# Altium footprint library Connectors.PcbLib: 36 footprints (part 1 of 3)
Each footprint in its own frame and in the unit in brackets; x right, y up, seen from the top. Pads: shape width x height; smd on the part's side, far side on the other; paste and mask are expansions set on the pad; w line width, h text height; cw(c..) or ccw(c..) is an arc to the next point about the centre after c.
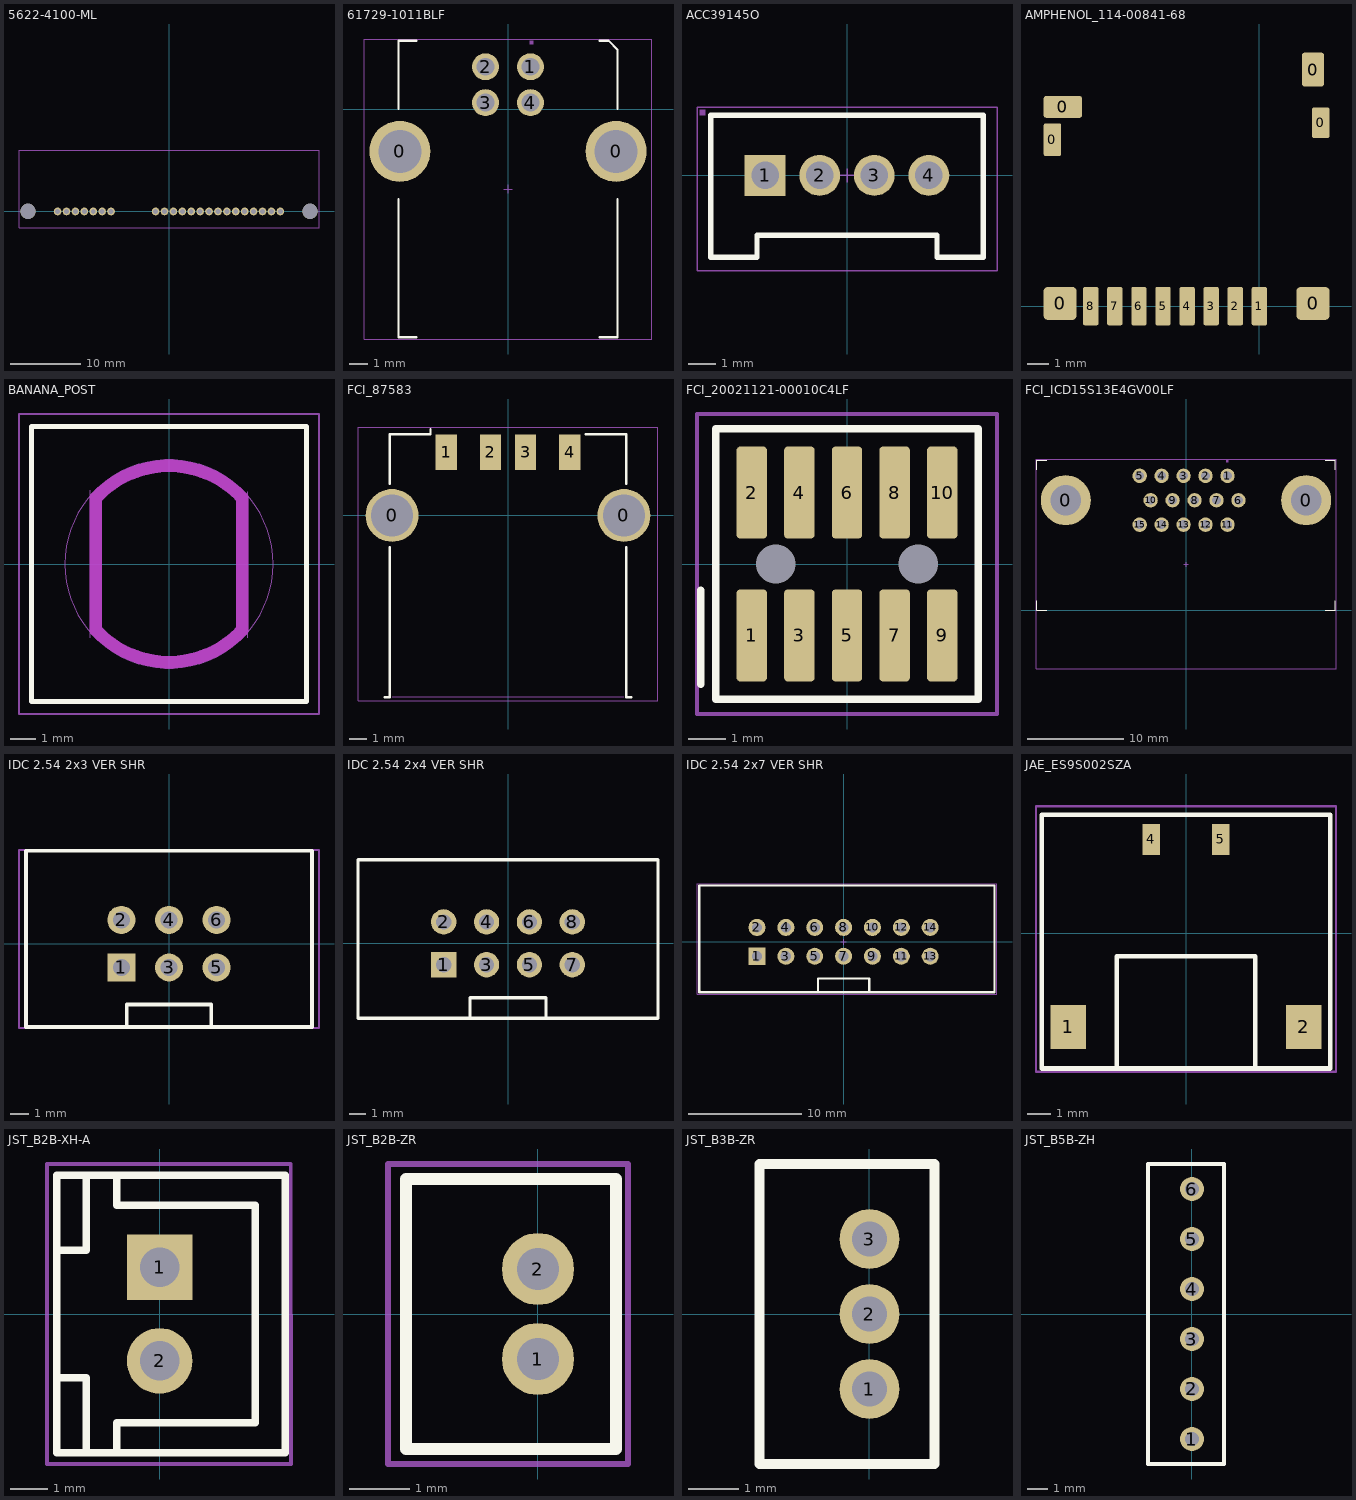
[diagram p0: the footprints below, top view; thin cyan lines are the x and y axes]

## 5622-4100-ML [mm] "SATA Combo connector"
height 5.6
pads (24):
  round 1.1 hole 0.7 unplated: P1(-1.91,0) P2(-0.64,0) P3(0.63,0) P4(1.9,0) P5(3.17,0) P6(4.44,0) P7(5.71,0) P8(6.98,0) P9(8.25,0) P10(9.52,0) P11(10.79,0) P12(12.06,0) P13(13.33,0) P14(14.6,0) P15(15.87,0) S1(-15.88,0) S2(-14.61,0) S3(-13.34,0) S4(-12.07,0) S5(-10.8,0) S6(-9.53,0) S7(-8.26,0)
  round 2.2 hole 2.2 unplated: ""(-20.1,0) ""(20.1,0)
15. Courtyard TOP:
  lines w0.1: -21.38,-2.3 21.38,-2.3 21.38,8.7 -21.38,8.7 -21.38,-2.3
  text ".designator" at -1.91,2.54 h2
3D body: height 5.6, standoff -2.5, extent -21.38,-2.3 21.38,8.7

## 61729-1011BLF [mm] "USB Connectors 4P R/A RECEPTACLE STYLE B"
height 10.3
pads (6):
  round 3.4 hole 2.4: 0(-6.02,-2.355) 0(6.02,-2.355)
  round 1.5 hole 1: 1(1.25,2.355) 2(-1.25,2.355) 3(-1.25,0.355) 4(1.25,0.355)
Top Overlay:
  lines w0.12: -6.1,-5 -6.1,-12.7 -5.1,-12.7 ; -6.1,0 -6.1,3.8 -5.1,3.8 ; 5.1,-12.7 6.1,-12.7 6.1,-5 ; 5.1,3.8 5.6,3.8 6.1,3.3 6.1,0
15. Courtyard TOP:
  lines w0.05: -0.25,-4.45 0.25,-4.45 ; 0,-4.7 0,-4.2 ; -8,-12.8 -8,3.9 8,3.9 8,-12.8 -8,-12.8
18. Assembly TOP:
  region: 1.4,3.8 1.4,3.6 1.2,3.6 1.2,3.8
  lines w0.05: -8,-12.8 -8,3.9 8,3.9 8,-12.8 -8,-12.8
  text ".designator" at -2.7,-5.2 h1.5
3D body: height 11.01, standoff -3.71, extent -7.449,-12.635 7.449,3.665

## ACC39145O [mm] "Grove standard 4-pin connector"
height 8
pads (4):
  rect 1.5x1.5 hole 1: 1(-3,0)
  round 1.5 hole 1: 2(-1,0) 3(1,0) 4(3,0)
Top Overlay:
  lines w0.2: -5,-3 -3.3,-3 -3.3,-2.2 3.3,-2.2 3.3,-3 5,-3 5,-2.2 5,2.2 -5,2.2 -5,-1.6 -5,-2.2 -5,-3
15. Courtyard TOP:
  lines w0.05: -0.25,0 0.25,0 ; 0,-0.25 0,0.25 ; -5.5,-3.5 -5.5,2.5 5.5,2.5 5.5,-3.5 -5.5,-3.5
18. Assembly TOP:
  region: -5.2,2.4 -5.2,2.2 -5.4,2.2 -5.4,2.4
  lines w0.05: -5.5,-3.5 -5.5,2.5 5.5,2.5 5.5,-3.5 -5.5,-3.5
  text ".designator" at -2.5,-0.8 h1.7

## AMPHENOL_114-00841-68 [mm] "MicroSD push memory card connector"
height 1.55
pads (14):
  rrect23% 0.8x1.5 smd: 0(-9.45,7.6)
  rrect23% 1.5x1.5 smd: 0(-9.1,0.125) 0(2.45,0.125)
  rrect23% 1.75x1 smd: 0(-8.975,9.1)
  rrect23% 1x1.55 smd: 0(2.45,10.8)
  rrect23% 0.8x1.4 smd: 0(2.8,8.375)
  rrect23% 0.7x1.75 smd: 1(0,0) 2(-1.1,0) 3(-2.2,0) 4(-3.3,0) 5(-4.4,0) 6(-5.5,0) 7(-6.6,0) 8(-7.7,0)

## BANANA_POST [mm] "Johnsen / Emerson 111-010X-001"
Top Overlay:
  lines w0.2: -5.5,-5.5 5.5,-5.5 5.5,5.5 -5.5,5.5 -5.5,-5.5
Keep-Out Layer:
  lines w0.5: -2.925,-2.625 -2.925,2.625 ; -2.922,-2.647 ccw(c0.001,0.057) 2.923,-2.648 ; -2.922,2.647 cw(c0.001,-0.057) 2.923,2.648 ; 2.925,-2.625 2.925,2.625
1. Fabnotes:
  circle w0.001: c0,0 r4.17
  lines w0.001: -3.153,-2.952 -3.153,2.952 ; 3.153,-2.952 3.153,2.9
4. Route path:
  lines w0.5: -2.925,-2.625 -2.925,2.625 ; -2.922,-2.647 ccw(c0.001,0.057) 2.923,-2.648 ; -2.922,2.647 cw(c0.001,-0.057) 2.923,2.648 ; 2.925,-2.625 2.925,2.625
15. Courtyard TOP:
  lines w0.1: -6,-6 6,-6 6,6 -5.5,6 -6,6 -6,-6
  text ".designator" at -1,-0.5 h1

## FCI_87583 [mm] "USB Type A receptacle"
height 7.74
pads (6):
  round 3 hole 2.36: 0(-6.57,0) 0(6.57,0)
  rect 1.2x2 smd: 1(-3.5,3.58) 2(-1,3.58) 3(1,3.58) 4(3.5,3.58)
Top Overlay:
  lines w0.12: -7,-10.3 -6.7,-10.3 -6.7,-1.8 ; -6.7,1.8 -6.7,4.6 -4.4,4.6 -4.4,4.9 ; 4.4,4.6 6.7,4.6 6.7,1.8 ; 6.7,-1.8 6.7,-10.3 7,-10.3
15. Courtyard TOP:
  lines w0.05: -8.5,-10.5 -8.5,0.2 -8.5,5 6.5,5 8.5,5 8.5,-0.1 8.5,-10.5 6.4,-10.5 -8.5,-10.5
20. Alignments:
  lines w0.05: -6.57,-10.28 6.57,-10.28

## FCI_20021121-00010C4LF [mm]
pads (12):
  rrect23% 0.81x2.45 smd: 1(-2.54,-1.905) 2(-2.54,1.905) 3(-1.27,-1.905) 4(-1.27,1.905) 5(0,-1.905) 6(0,1.905) 7(1.27,-1.905) 8(1.27,1.905) 9(2.54,-1.905) 10(2.54,1.905)
  round 0 hole 1.05 unplated: ""(-1.905,0) ""(1.905,0)
Top Overlay:
  lines w0.2: -3.9,-3.2 -3.9,-0.7 ; -3.5,-3.6 3.5,-3.6 3.5,3.6 -3.5,3.6 -3.5,-3.6
15. Courtyard TOP:
  lines w0.1: -4,-4 4,-4 4,4 -4,4 -4,-4
  text ".designator" at -1,-0.5 h1
  text "." at -3,-3 h1

## FCI_ICD15S13E4GV00LF [mm] "DSUB-15 (VGA connector)"
height 13
pads (17):
  round 5.2 / inner round 0 / far side round 5.2 hole 3.2: 0(-12.505,11.43) 0(12.505,11.43)
  round 1.5 / inner round 0.92 / far side round 1.5 hole 0.92: 1(4.315,13.97) 2(2.03,13.97) 3(-0.255,13.97) 4(-2.54,13.97) 5(-4.825,13.97) 6(5.457,11.43) 7(3.173,11.43) 8(0.888,11.43) 9(-1.398,11.43) 10(-3.682,11.43) 11(4.315,8.89) 12(2.03,8.89) 13(-0.255,8.89) 14(-2.54,8.89) 15(-4.825,8.89)
Top Overlay:
  lines w0.12: -15.5,1 -15.5,0 -14.5,0 ; -15.5,14.6 -15.5,15.6 -14.5,15.6 ; 14.5,0 15.5,0 15.5,1 ; 14.5,15.6 15.5,15.6 15.5,14.6
15. Courtyard TOP:
  lines w0.05: -0.25,4.75 0.25,4.75 ; 0,4.5 0,5 ; -15.6,-6.1 -15.6,15.7 15.6,15.7 15.6,-6.1 -15.6,-6.1
18. Assembly TOP:
  region: 4.4,15.6 4.4,15.4 4.2,15.4 4.2,15.6
  lines w0.05: -15.6,-6.1 15.6,-6.1 15.6,15.7 -15.6,15.7 -15.6,-6.1
  text ".designator" at -2.7,4.1 h1.5
3D body: height 12.55, standoff -3.2, extent -15.5,-6.05 15.5,15.58

## IDC 2.54 2x3 VER SHR [mm] "IDC Header, pitch 2.54mm, 2x3pins Vertical mounted, Shrouded"
height 9.57
pads (6):
  rect 1.5x1.5 hole 0.9: 1(-2.54,-1.27)
  round 1.5 hole 0.9: 2(-2.54,1.27) 3(0,-1.27) 4(0,1.27) 5(2.54,-1.27) 6(2.54,1.27)
Top Overlay:
  lines w0.2: -2.25,-4.445 -2.25,-3.25 2.25,-3.25 2.25,-4.445 ; -7.62,-4.445 7.62,-4.445 7.62,4.953 -7.62,4.953 -7.62,-4.445
15. Courtyard TOP:
  lines w0.1: -8,-4.5 8,-4.5 8,5 -8,5 -8,-4.5
  text ".designator" at -2.032,-0.889 h2
3D body: height 9.1, standoff -3.1, extent -7.62,-4.475 7.62,4.975

## IDC 2.54 2x4 VER SHR [mm] "IDC Header, pitch 2.54mm, 2x4pins Vertical mounted, Shrouded"
height 9.57
pads (8):
  rect 1.5x1.5 hole 0.9: 1(-3.81,-1.27)
  round 1.5 hole 0.9: 2(-3.81,1.27) 3(-1.27,-1.27) 4(-1.27,1.27) 5(1.27,-1.27) 6(1.27,1.27) 7(3.81,-1.27) 8(3.81,1.27)
Top Overlay:
  lines w0.2: -2.25,-4.415 -2.25,-3.22 2.25,-3.22 2.25,-4.415 ; -8.89,-4.445 8.89,-4.445 8.89,4.953 -8.89,4.953 -8.89,-4.445
15. Courtyard TOP:
  lines w0.1: -8.89,-4.445 8.89,-4.445 8.89,4.953 -8.89,4.953 -8.89,-4.445
  text ".designator" at -3.302,-0.889 h2
3D body: height 9.02, standoff -3.13, extent -8.89,-4.475 8.89,4.725

## IDC 2.54 2x7 VER SHR [mm] "IDC Header, pitch 2.54mm, 2x7pins Vertical mounted, Shrouded"
height 9.57
pads (14):
  rect 1.5x1.5 hole 0.9: 1(-7.62,-1.27)
  round 1.5 hole 0.9: 2(-7.62,1.27) 3(-5.08,-1.27) 4(-5.08,1.27) 5(-2.54,-1.27) 6(-2.54,1.27) 7(0,-1.27) 8(0,1.27) 9(2.54,-1.27) 10(2.54,1.27) 11(5.08,-1.27) 12(5.08,1.27) 13(7.62,-1.27) 14(7.62,1.27)
Top Overlay:
  lines w0.2: -2.25,-4.415 -2.25,-3.22 2.25,-3.22 2.25,-4.415 ; -12.7,-4.445 13.282,-4.445 13.282,4.953 -12.7,4.953 -12.7,-4.445
15. Courtyard TOP:
  lines w0.05: -0.25,0 0.25,0 ; 0,-0.25 0,0.25 ; -12.9,-4.6 13.5,-4.6 13.5,5.1 -12.9,5.1 -12.9,-4.6
18. Assembly TOP:
  region: -12.8,-4.5 -12.8,-4.3 -12.6,-4.3 -12.6,-4.5
  lines w0.05: -12.9,-4.6 -12.9,5.1 13.5,5.1 13.5,-4.6 -12.9,-4.6
  text ".designator" at -2.75,-0.75 h1.5
3D body: height 9.42, standoff -3.28, extent -12.7,-4.397 12.7,4.953

## JAE_ES9S002SZA [mm] "Lighting Connectors ES9 2 Pin Socket 3.0mm Pitch"
height 3
pads (4):
  rect 1.55x1.9 smd paste+0 mask+0: 1(-5.1,-4.062) 2(5.1,-4.062)
  rect 0.75x1.35 smd paste+0 mask+0: 4(-1.5,4.063) 5(1.5,4.063)
Top Overlay:
  lines w0.2: -3,-5.862 -3,-1 3,-1 3,-5.862 ; -6.25,-5.862 -6.25,5.138 6.25,5.138 6.25,-5.862 -6.25,-5.862
15. Courtyard TOP:
  lines w0.1: -6.5,-6 6.5,-6 6.5,5.5 -6.5,5.5 -6.5,-6
  text ".designator" at -1.8,-0.6 h2

## JST_B2B-XH-A [mm]
height 6
pads (2):
  rect 1.75x1.75 hole 1.05: 1(0,1.25)
  round 1.75 hole 1.05: 2(0,-1.25)
Top Overlay:
  lines w0.2: -2.75,-1.7 -1.95,-1.7 -1.95,-3.7 ; -2.75,1.7 -1.95,1.7 -1.95,3.7 ; -1.15,-3.7 -1.15,-2.9 2.55,-2.9 2.55,2.9 -1.15,2.9 -1.15,3.7 ; -2.75,-3.7 3.35,-3.7 3.35,3.7 -2.75,3.7 -2.75,-3.7
15. Courtyard TOP:
  lines w0.1: -3,-4 -3,4 3.5,4 3.5,-4 -3,-4
  text ".designator" at -1.27,-0.762 h1.5
3D body: height 7.02, standoff -3.38, extent -2.75,-3.7 3.35,3.7

## JST_B2B-ZR [mm]
height 6
pads (2):
  round 1.2 hole 0.7: 1(0,-0.75) 2(0,0.75)
Top Overlay:
  lines w0.2: -2.2,-2.25 -2.2,2.25 1.3,2.25 1.3,-2.25 -2.2,-2.25
15. Courtyard TOP:
  lines w0.1: -2.5,-2.5 1.5,-2.5 1.5,2.5 -2.5,2.5 -2.5,-2.5
  text "." at 0.7,-1.85 h1
  text ".designator" at -1,0.25 h1.5

## JST_B3B-ZR [mm]
height 6
pads (3):
  round 1.2 hole 0.7: 1(0,-1.5) 2(0,0) 3(0,1.5)
Top Overlay:
  lines w0.2: -2.2,-3 1.3,-3 1.3,3 -2.2,3 -2.2,-3
15. Courtyard TOP:
  lines w0.1: -2.2,-3 -2.2,3 1.3,3 1.3,-3 -2.2,-3
  text ".designator" at -1,-0.5 h1.5
  text "." at 0.7,-2.6 h1

## JST_B5B-ZH [mm] "2.5mm pitch/Disconnectable Crimp style connector"
height 6
pads (6):
  round 1.2 hole 0.7: 1(0,-6.25) 2(0,-3.75) 3(0,-1.25) 4(0,1.25) 5(0,3.75) 6(0,6.25)
Top Overlay:
  lines w0.2: -2.2,-7.5 1.6,-7.5 1.6,7.5 -2.2,7.5 -2.2,-7.5
15. Courtyard TOP:
  lines w0.1: -2.2,-7.5 -2.2,7.5 1.6,7.5 1.6,-7.5 -2.2,-7.5
  text ".designator" at 0.33,-2.261 h1.5
  text "." at 0.7,-7.35 h1